# Altium schematic symbol library jlcpcb_2025_04_resistors_extended_1210.schlib: 2670 symbols (part 8 of 14) (continued)
## CR1210J30102G
designator R?  Resistance: 1kΩ  (hidden comment: *)
Resistor, 1kΩ, ±5%, 750mW, 200V, ±200ppm/℃, -55℃~+125℃, SMD 1210; Manufacturer: Uniroyal; Manufacturer Part Number: CR1210J30102G; Supplier 1: LCSC; Supplier Part Number 1: C102400; JLCPCB Part Number: C102400; Power Rating: 750mW; Category: Resistors; Package Size: 1210; JLCPCB Basic Part: Yes; Tolerance: ±5%; Voltage Rating: 200V; Temperature Coefficient: ±200ppm/℃; Temperature Rating: -55℃~+125℃; ComponentLink1Description: Datasheet; ComponentLink1URL: https://wmsc.lcsc.com/wmsc/upload/file/pdf/v2/lcsc/2304140030_LIZ-Elec-CR1210J30102G_C102400.pdf; ComponentLink2Description: JLCPCB Part URL; ComponentLink2URL: https://jlcpcb.com/partdetail/C102400
pins: 1, 2
1 alternate drawing of the same symbol

## CR1210J30103G
designator R?  Resistance: 10kΩ  (hidden comment: *)
Resistor, 10kΩ, ±5%, 750mW, 200V, ±200ppm/℃, -55℃~+125℃, SMD 1210; Manufacturer: Uniroyal; Manufacturer Part Number: CR1210J30103G; Supplier 1: LCSC; Supplier Part Number 1: C102401; JLCPCB Part Number: C102401; Power Rating: 750mW; Category: Resistors; Package Size: 1210; JLCPCB Basic Part: Yes; Tolerance: ±5%; Voltage Rating: 200V; Temperature Coefficient: ±200ppm/℃; Temperature Rating: -55℃~+125℃; ComponentLink1Description: Datasheet; ComponentLink1URL: https://wmsc.lcsc.com/wmsc/upload/file/pdf/v2/lcsc/2304140030_LIZ-Elec-CR1210J30103G_C102401.pdf; ComponentLink2Description: JLCPCB Part URL; ComponentLink2URL: https://jlcpcb.com/partdetail/C102401
pins: 1, 2
1 alternate drawing of the same symbol

## CR1210J30104G
designator R?  Resistance: 100kΩ  (hidden comment: *)
Resistor, 100kΩ, ±5%, 333.333mW, 200V, ±200ppm/℃, -55℃~+125℃, SMD 1210; Manufacturer: Uniroyal; Manufacturer Part Number: CR1210J30104G; Supplier 1: LCSC; Supplier Part Number 1: C102402; JLCPCB Part Number: C102402; Power Rating: 333.333mW; Category: Resistors; Package Size: 1210; JLCPCB Basic Part: Yes; Tolerance: ±5%; Voltage Rating: 200V; Temperature Coefficient: ±200ppm/℃; Temperature Rating: -55℃~+125℃; ComponentLink1Description: Datasheet; ComponentLink1URL: https://wmsc.lcsc.com/wmsc/upload/file/pdf/v2/lcsc/2304171100_LIZ-Elec-CR1210J30104G_C102402.pdf; ComponentLink2Description: JLCPCB Part URL; ComponentLink2URL: https://jlcpcb.com/partdetail/C102402
pins: 1, 2
1 alternate drawing of the same symbol

## CR1210J30105G
designator R?  Resistance: 1MΩ  (hidden comment: *)
Resistor, 1MΩ, ±5%, 750mW, 200V, ±200ppm/℃, -55℃~+125℃, SMD 1210; Manufacturer: Uniroyal; Manufacturer Part Number: CR1210J30105G; Supplier 1: LCSC; Supplier Part Number 1: C102403; JLCPCB Part Number: C102403; Power Rating: 750mW; Category: Resistors; Package Size: 1210; JLCPCB Basic Part: Yes; Tolerance: ±5%; Voltage Rating: 200V; Temperature Coefficient: ±200ppm/℃; Temperature Rating: -55℃~+125℃; ComponentLink1Description: Datasheet; ComponentLink1URL: https://wmsc.lcsc.com/wmsc/upload/file/pdf/v2/lcsc/2304140030_LIZ-Elec-CR1210J30105G_C102403.pdf; ComponentLink2Description: JLCPCB Part URL; ComponentLink2URL: https://jlcpcb.com/partdetail/C102403
pins: 1, 2
1 alternate drawing of the same symbol

## CR1210J30111G
designator R?  Resistance: 110Ω  (hidden comment: *)
Resistor, 110Ω, ±5%, 750mW, 200V, ±200ppm/℃, -55℃~+125℃, SMD 1210; Manufacturer: Uniroyal; Manufacturer Part Number: CR1210J30111G; Supplier 1: LCSC; Supplier Part Number 1: C102405; JLCPCB Part Number: C102405; Power Rating: 750mW; Category: Resistors; Package Size: 1210; JLCPCB Basic Part: Yes; Tolerance: ±5%; Voltage Rating: 200V; Temperature Coefficient: ±200ppm/℃; Temperature Rating: -55℃~+125℃; ComponentLink1Description: Datasheet; ComponentLink1URL: https://wmsc.lcsc.com/wmsc/upload/file/pdf/v2/lcsc/2304140030_LIZ-Elec-CR1210J30111G_C102405.pdf; ComponentLink2Description: JLCPCB Part URL; ComponentLink2URL: https://jlcpcb.com/partdetail/C102405
pins: 1, 2
1 alternate drawing of the same symbol

## CR1210J30120G
designator R?  Resistance: 12Ω  (hidden comment: *)
Resistor, 12Ω, ±5%, 750mW, 200V, ±200ppm/℃, -55℃~+125℃, SMD 1210; Manufacturer: Uniroyal; Manufacturer Part Number: CR1210J30120G; Supplier 1: LCSC; Supplier Part Number 1: C102408; JLCPCB Part Number: C102408; Power Rating: 750mW; Category: Resistors; Package Size: 1210; JLCPCB Basic Part: Yes; Tolerance: ±5%; Voltage Rating: 200V; Temperature Coefficient: ±200ppm/℃; Temperature Rating: -55℃~+125℃; ComponentLink1Description: Datasheet; ComponentLink1URL: https://wmsc.lcsc.com/wmsc/upload/file/pdf/v2/lcsc/2304140030_LIZ-Elec-CR1210J30120G_C102408.pdf; ComponentLink2Description: JLCPCB Part URL; ComponentLink2URL: https://jlcpcb.com/partdetail/C102408
pins: 1, 2
1 alternate drawing of the same symbol

## CR1210J30121G
designator R?  Resistance: 120Ω  (hidden comment: *)
Resistor, 120Ω, ±5%, 750mW, 200V, ±200ppm/℃, -55℃~+125℃, SMD 1210; Manufacturer: Uniroyal; Manufacturer Part Number: CR1210J30121G; Supplier 1: LCSC; Supplier Part Number 1: C102409; JLCPCB Part Number: C102409; Power Rating: 750mW; Category: Resistors; Package Size: 1210; JLCPCB Basic Part: Yes; Tolerance: ±5%; Voltage Rating: 200V; Temperature Coefficient: ±200ppm/℃; Temperature Rating: -55℃~+125℃; ComponentLink1Description: Datasheet; ComponentLink1URL: https://wmsc.lcsc.com/wmsc/upload/file/pdf/v2/lcsc/2304140030_LIZ-Elec-CR1210J30121G_C102409.pdf; ComponentLink2Description: JLCPCB Part URL; ComponentLink2URL: https://jlcpcb.com/partdetail/C102409
pins: 1, 2
1 alternate drawing of the same symbol

## CR1210J30122G
designator R?  Resistance: 1.2kΩ  (hidden comment: *)
Resistor, 1.2kΩ, ±5%, 750mW, 200V, ±200ppm/℃, -55℃~+125℃, SMD 1210; Manufacturer: Uniroyal; Manufacturer Part Number: CR1210J30122G; Supplier 1: LCSC; Supplier Part Number 1: C102410; JLCPCB Part Number: C102410; Power Rating: 750mW; Category: Resistors; Package Size: 1210; JLCPCB Basic Part: Yes; Tolerance: ±5%; Voltage Rating: 200V; Temperature Coefficient: ±200ppm/℃; Temperature Rating: -55℃~+125℃; ComponentLink1Description: Datasheet; ComponentLink1URL: https://wmsc.lcsc.com/wmsc/upload/file/pdf/v2/lcsc/2304140030_LIZ-Elec-CR1210J30122G_C102410.pdf; ComponentLink2Description: JLCPCB Part URL; ComponentLink2URL: https://jlcpcb.com/partdetail/C102410
pins: 1, 2
1 alternate drawing of the same symbol

## CR1210J30124G
designator R?  Resistance: 120kΩ  (hidden comment: *)
Resistor, 120kΩ, ±5%, 750mW, 200V, ±200ppm/℃, -55℃~+125℃, SMD 1210; Manufacturer: Uniroyal; Manufacturer Part Number: CR1210J30124G; Supplier 1: LCSC; Supplier Part Number 1: C102411; JLCPCB Part Number: C102411; Power Rating: 750mW; Category: Resistors; Package Size: 1210; JLCPCB Basic Part: Yes; Tolerance: ±5%; Voltage Rating: 200V; Temperature Coefficient: ±200ppm/℃; Temperature Rating: -55℃~+125℃; ComponentLink1Description: Datasheet; ComponentLink1URL: https://wmsc.lcsc.com/wmsc/upload/file/pdf/v2/lcsc/2304140030_LIZ-Elec-CR1210J30124G_C102411.pdf; ComponentLink2Description: JLCPCB Part URL; ComponentLink2URL: https://jlcpcb.com/partdetail/C102411
pins: 1, 2
1 alternate drawing of the same symbol

## CR1210J30130G
designator R?  Resistance: 13Ω  (hidden comment: *)
Resistor, 13Ω, ±5%, 750mW, 200V, ±200ppm/℃, -55℃~+125℃, SMD 1210; Manufacturer: Uniroyal; Manufacturer Part Number: CR1210J30130G; Supplier 1: LCSC; Supplier Part Number 1: C102412; JLCPCB Part Number: C102412; Power Rating: 750mW; Category: Resistors; Package Size: 1210; JLCPCB Basic Part: Yes; Tolerance: ±5%; Voltage Rating: 200V; Temperature Coefficient: ±200ppm/℃; Temperature Rating: -55℃~+125℃; ComponentLink1Description: Datasheet; ComponentLink1URL: https://wmsc.lcsc.com/wmsc/upload/file/pdf/v2/lcsc/2304140030_LIZ-Elec-CR1210J30130G_C102412.pdf; ComponentLink2Description: JLCPCB Part URL; ComponentLink2URL: https://jlcpcb.com/partdetail/C102412
pins: 1, 2
1 alternate drawing of the same symbol

## CR1210J30150G
designator R?  Resistance: 15Ω  (hidden comment: *)
Resistor, 15Ω, ±5%, 750mW, 200V, ±200ppm/℃, -55℃~+125℃, SMD 1210; Manufacturer: Uniroyal; Manufacturer Part Number: CR1210J30150G; Supplier 1: LCSC; Supplier Part Number 1: C102413; JLCPCB Part Number: C102413; Power Rating: 750mW; Category: Resistors; Package Size: 1210; JLCPCB Basic Part: Yes; Tolerance: ±5%; Voltage Rating: 200V; Temperature Coefficient: ±200ppm/℃; Temperature Rating: -55℃~+125℃; ComponentLink1Description: Datasheet; ComponentLink1URL: https://wmsc.lcsc.com/wmsc/upload/file/pdf/v2/lcsc/2304140030_LIZ-Elec-CR1210J30150G_C102413.pdf; ComponentLink2Description: JLCPCB Part URL; ComponentLink2URL: https://jlcpcb.com/partdetail/C102413
pins: 1, 2
1 alternate drawing of the same symbol

## CR1210J30152G
designator R?  Resistance: 1.5kΩ  (hidden comment: *)
Resistor, 1.5kΩ, ±5%, 750mW, 200V, ±200ppm/℃, -55℃~+125℃, SMD 1210; Manufacturer: Uniroyal; Manufacturer Part Number: CR1210J30152G; Supplier 1: LCSC; Supplier Part Number 1: C102415; JLCPCB Part Number: C102415; Power Rating: 750mW; Category: Resistors; Package Size: 1210; JLCPCB Basic Part: Yes; Tolerance: ±5%; Voltage Rating: 200V; Temperature Coefficient: ±200ppm/℃; Temperature Rating: -55℃~+125℃; ComponentLink1Description: Datasheet; ComponentLink1URL: https://wmsc.lcsc.com/wmsc/upload/file/pdf/v2/lcsc/2304140030_LIZ-Elec-CR1210J30152G_C102415.pdf; ComponentLink2Description: JLCPCB Part URL; ComponentLink2URL: https://jlcpcb.com/partdetail/C102415
pins: 1, 2
1 alternate drawing of the same symbol

## CR1210J30154G
designator R?  Resistance: 150kΩ  (hidden comment: *)
Resistor, 150kΩ, ±5%, 750mW, 200V, ±200ppm/℃, -55℃~+125℃, SMD 1210; Manufacturer: Uniroyal; Manufacturer Part Number: CR1210J30154G; Supplier 1: LCSC; Supplier Part Number 1: C102416; JLCPCB Part Number: C102416; Power Rating: 750mW; Category: Resistors; Package Size: 1210; JLCPCB Basic Part: Yes; Tolerance: ±5%; Voltage Rating: 200V; Temperature Coefficient: ±200ppm/℃; Temperature Rating: -55℃~+125℃; ComponentLink1Description: Datasheet; ComponentLink1URL: https://wmsc.lcsc.com/wmsc/upload/file/pdf/v2/lcsc/2304140030_LIZ-Elec-CR1210J30154G_C102416.pdf; ComponentLink2Description: JLCPCB Part URL; ComponentLink2URL: https://jlcpcb.com/partdetail/C102416
pins: 1, 2
1 alternate drawing of the same symbol

## CR1210J30161G
designator R?  Resistance: 160Ω  (hidden comment: *)
Resistor, 160Ω, ±5%, 750mW, 200V, ±200ppm/℃, -55℃~+125℃, SMD 1210; Manufacturer: Uniroyal; Manufacturer Part Number: CR1210J30161G; Supplier 1: LCSC; Supplier Part Number 1: C102418; JLCPCB Part Number: C102418; Power Rating: 750mW; Category: Resistors; Package Size: 1210; JLCPCB Basic Part: Yes; Tolerance: ±5%; Voltage Rating: 200V; Temperature Coefficient: ±200ppm/℃; Temperature Rating: -55℃~+125℃; ComponentLink1Description: Datasheet; ComponentLink1URL: https://wmsc.lcsc.com/wmsc/upload/file/pdf/v2/lcsc/2304140030_LIZ-Elec-CR1210J30161G_C102418.pdf; ComponentLink2Description: JLCPCB Part URL; ComponentLink2URL: https://jlcpcb.com/partdetail/C102418
pins: 1, 2
1 alternate drawing of the same symbol

## CR1210J30180G
designator R?  Resistance: 18Ω  (hidden comment: *)
Resistor, 18Ω, ±5%, 750mW, 200V, ±200ppm/℃, -55℃~+125℃, SMD 1210; Manufacturer: Uniroyal; Manufacturer Part Number: CR1210J30180G; Supplier 1: LCSC; Supplier Part Number 1: C102419; JLCPCB Part Number: C102419; Power Rating: 750mW; Category: Resistors; Package Size: 1210; JLCPCB Basic Part: Yes; Tolerance: ±5%; Voltage Rating: 200V; Temperature Coefficient: ±200ppm/℃; Temperature Rating: -55℃~+125℃; ComponentLink1Description: Datasheet; ComponentLink1URL: https://wmsc.lcsc.com/wmsc/upload/file/pdf/v2/lcsc/2304140030_LIZ-Elec-CR1210J30180G_C102419.pdf; ComponentLink2Description: JLCPCB Part URL; ComponentLink2URL: https://jlcpcb.com/partdetail/C102419
pins: 1, 2
1 alternate drawing of the same symbol

## CR1210J30201G
designator R?  Resistance: 200Ω  (hidden comment: *)
Resistor, 200Ω, ±5%, 750mW, 200V, ±200ppm/℃, -55℃~+125℃, SMD 1210; Manufacturer: Uniroyal; Manufacturer Part Number: CR1210J30201G; Supplier 1: LCSC; Supplier Part Number 1: C102427; JLCPCB Part Number: C102427; Power Rating: 750mW; Category: Resistors; Package Size: 1210; JLCPCB Basic Part: Yes; Tolerance: ±5%; Voltage Rating: 200V; Temperature Coefficient: ±200ppm/℃; Temperature Rating: -55℃~+125℃; ComponentLink1Description: Datasheet; ComponentLink1URL: https://wmsc.lcsc.com/wmsc/upload/file/pdf/v2/lcsc/2304140030_LIZ-Elec-CR1210J30201G_C102427.pdf; ComponentLink2Description: JLCPCB Part URL; ComponentLink2URL: https://jlcpcb.com/partdetail/C102427
pins: 1, 2
1 alternate drawing of the same symbol

## CR1210J30202G
designator R?  Resistance: 2kΩ  (hidden comment: *)
Resistor, 2kΩ, ±5%, 750mW, 200V, ±200ppm/℃, -55℃~+125℃, SMD 1210; Manufacturer: Uniroyal; Manufacturer Part Number: CR1210J30202G; Supplier 1: LCSC; Supplier Part Number 1: C102428; JLCPCB Part Number: C102428; Power Rating: 750mW; Category: Resistors; Package Size: 1210; JLCPCB Basic Part: Yes; Tolerance: ±5%; Voltage Rating: 200V; Temperature Coefficient: ±200ppm/℃; Temperature Rating: -55℃~+125℃; ComponentLink1Description: Datasheet; ComponentLink1URL: https://wmsc.lcsc.com/wmsc/upload/file/pdf/v2/lcsc/2304140030_LIZ-Elec-CR1210J30202G_C102428.pdf; ComponentLink2Description: JLCPCB Part URL; ComponentLink2URL: https://jlcpcb.com/partdetail/C102428
pins: 1, 2
1 alternate drawing of the same symbol

## CR1210J30203G
designator R?  Resistance: 20kΩ  (hidden comment: *)
Resistor, 20kΩ, ±5%, 750mW, 200V, ±200ppm/℃, -55℃~+125℃, SMD 1210; Manufacturer: Uniroyal; Manufacturer Part Number: CR1210J30203G; Supplier 1: LCSC; Supplier Part Number 1: C102429; JLCPCB Part Number: C102429; Power Rating: 750mW; Category: Resistors; Package Size: 1210; JLCPCB Basic Part: Yes; Tolerance: ±5%; Voltage Rating: 200V; Temperature Coefficient: ±200ppm/℃; Temperature Rating: -55℃~+125℃; ComponentLink1Description: Datasheet; ComponentLink1URL: https://wmsc.lcsc.com/wmsc/upload/file/pdf/v2/lcsc/2304140030_LIZ-Elec-CR1210J30203G_C102429.pdf; ComponentLink2Description: JLCPCB Part URL; ComponentLink2URL: https://jlcpcb.com/partdetail/C102429
pins: 1, 2
1 alternate drawing of the same symbol

## CR1210J30204G
designator R?  Resistance: 200kΩ  (hidden comment: *)
Resistor, 200kΩ, ±5%, 750mW, 200V, ±200ppm/℃, -55℃~+125℃, SMD 1210; Manufacturer: Uniroyal; Manufacturer Part Number: CR1210J30204G; Supplier 1: LCSC; Supplier Part Number 1: C102430; JLCPCB Part Number: C102430; Power Rating: 750mW; Category: Resistors; Package Size: 1210; JLCPCB Basic Part: Yes; Tolerance: ±5%; Voltage Rating: 200V; Temperature Coefficient: ±200ppm/℃; Temperature Rating: -55℃~+125℃; ComponentLink1Description: Datasheet; ComponentLink1URL: https://wmsc.lcsc.com/wmsc/upload/file/pdf/v2/lcsc/2304140030_LIZ-Elec-CR1210J30204G_C102430.pdf; ComponentLink2Description: JLCPCB Part URL; ComponentLink2URL: https://jlcpcb.com/partdetail/C102430
pins: 1, 2
1 alternate drawing of the same symbol

## CR1210J30221G
designator R?  Resistance: 220Ω  (hidden comment: *)
Resistor, 220Ω, ±5%, SMD 1210; Manufacturer: Uniroyal; Manufacturer Part Number: CR1210J30221G; Supplier 1: LCSC; Supplier Part Number 1: C102433; JLCPCB Part Number: C102433; Category: Resistors; Package Size: 1210; JLCPCB Basic Part: Yes; Tolerance: ±5%; ComponentLink1Description: Datasheet; ComponentLink1URL: https://wmsc.lcsc.com/wmsc/upload/file/pdf/v2/lcsc/2304140030_LIZ-Elec-CR1210J30221G_C102433.pdf; ComponentLink2Description: JLCPCB Part URL; ComponentLink2URL: https://jlcpcb.com/partdetail/C102433
pins: 1, 2
1 alternate drawing of the same symbol

## CR1210J30222G
designator R?  Resistance: 2.2kΩ  (hidden comment: *)
Resistor, 2.2kΩ, ±5%, SMD 1210; Manufacturer: Uniroyal; Manufacturer Part Number: CR1210J30222G; Supplier 1: LCSC; Supplier Part Number 1: C102434; JLCPCB Part Number: C102434; Category: Resistors; Package Size: 1210; JLCPCB Basic Part: Yes; Tolerance: ±5%; ComponentLink1Description: Datasheet; ComponentLink1URL: https://wmsc.lcsc.com/wmsc/upload/file/pdf/v2/lcsc/2304140030_LIZ-Elec-CR1210J30222G_C102434.pdf; ComponentLink2Description: JLCPCB Part URL; ComponentLink2URL: https://jlcpcb.com/partdetail/C102434
pins: 1, 2
1 alternate drawing of the same symbol

## CR1210J30223G
designator R?  Resistance: 22kΩ  (hidden comment: *)
Resistor, 22kΩ, ±5%, 333.333mW, SMD 1210; Manufacturer: Uniroyal; Manufacturer Part Number: CR1210J30223G; Supplier 1: LCSC; Supplier Part Number 1: C102435; JLCPCB Part Number: C102435; Power Rating: 333.333mW; Category: Resistors; Package Size: 1210; JLCPCB Basic Part: Yes; Tolerance: ±5%; ComponentLink1Description: Datasheet; ComponentLink1URL: https://wmsc.lcsc.com/wmsc/upload/file/pdf/v2/lcsc/2304140030_LIZ-Elec-CR1210J30223G_C102435.pdf; ComponentLink2Description: JLCPCB Part URL; ComponentLink2URL: https://jlcpcb.com/partdetail/C102435
pins: 1, 2
1 alternate drawing of the same symbol

## CR1210J30224G
designator R?  Resistance: 220kΩ  (hidden comment: *)
Resistor, 220kΩ, ±5%, 750mW, 200V, ±200ppm/℃, -55℃~+125℃, SMD 1210; Manufacturer: Uniroyal; Manufacturer Part Number: CR1210J30224G; Supplier 1: LCSC; Supplier Part Number 1: C102436; JLCPCB Part Number: C102436; Power Rating: 750mW; Category: Resistors; Package Size: 1210; JLCPCB Basic Part: Yes; Tolerance: ±5%; Voltage Rating: 200V; Temperature Coefficient: ±200ppm/℃; Temperature Rating: -55℃~+125℃; ComponentLink1Description: Datasheet; ComponentLink1URL: https://wmsc.lcsc.com/wmsc/upload/file/pdf/v2/lcsc/2304140030_LIZ-Elec-CR1210J30224G_C102436.pdf; ComponentLink2Description: JLCPCB Part URL; ComponentLink2URL: https://jlcpcb.com/partdetail/C102436
pins: 1, 2
1 alternate drawing of the same symbol

## CR1210J30240G
designator R?  Resistance: 24Ω  (hidden comment: *)
Resistor, 24Ω, ±5%, 750mW, 200V, ±200ppm/℃, -55℃~+125℃, SMD 1210; Manufacturer: Uniroyal; Manufacturer Part Number: CR1210J30240G; Supplier 1: LCSC; Supplier Part Number 1: C102437; JLCPCB Part Number: C102437; Power Rating: 750mW; Category: Resistors; Package Size: 1210; JLCPCB Basic Part: Yes; Tolerance: ±5%; Voltage Rating: 200V; Temperature Coefficient: ±200ppm/℃; Temperature Rating: -55℃~+125℃; ComponentLink1Description: Datasheet; ComponentLink1URL: https://wmsc.lcsc.com/wmsc/upload/file/pdf/v2/lcsc/2304140030_LIZ-Elec-CR1210J30240G_C102437.pdf; ComponentLink2Description: JLCPCB Part URL; ComponentLink2URL: https://jlcpcb.com/partdetail/C102437
pins: 1, 2
1 alternate drawing of the same symbol

## CR1210J30241G
designator R?  Resistance: 240Ω  (hidden comment: *)
Resistor, 240Ω, ±5%, 750mW, 200V, ±200ppm/℃, -55℃~+125℃, SMD 1210; Manufacturer: Uniroyal; Manufacturer Part Number: CR1210J30241G; Supplier 1: LCSC; Supplier Part Number 1: C102438; JLCPCB Part Number: C102438; Power Rating: 750mW; Category: Resistors; Package Size: 1210; JLCPCB Basic Part: Yes; Tolerance: ±5%; Voltage Rating: 200V; Temperature Coefficient: ±200ppm/℃; Temperature Rating: -55℃~+125℃; ComponentLink1Description: Datasheet; ComponentLink1URL: https://wmsc.lcsc.com/wmsc/upload/file/pdf/v2/lcsc/2304140030_LIZ-Elec-CR1210J30241G_C102438.pdf; ComponentLink2Description: JLCPCB Part URL; ComponentLink2URL: https://jlcpcb.com/partdetail/C102438
pins: 1, 2
1 alternate drawing of the same symbol

## CR1210J30244G
designator R?  Resistance: 240kΩ  (hidden comment: *)
Resistor, 240kΩ, ±5%, 750mW, 200V, ±200ppm/℃, -55℃~+125℃, SMD 1210; Manufacturer: Uniroyal; Manufacturer Part Number: CR1210J30244G; Supplier 1: LCSC; Supplier Part Number 1: C102441; JLCPCB Part Number: C102441; Power Rating: 750mW; Category: Resistors; Package Size: 1210; JLCPCB Basic Part: Yes; Tolerance: ±5%; Voltage Rating: 200V; Temperature Coefficient: ±200ppm/℃; Temperature Rating: -55℃~+125℃; ComponentLink1Description: Datasheet; ComponentLink1URL: https://wmsc.lcsc.com/wmsc/upload/file/pdf/v2/lcsc/2304140030_LIZ-Elec-CR1210J30244G_C102441.pdf; ComponentLink2Description: JLCPCB Part URL; ComponentLink2URL: https://jlcpcb.com/partdetail/C102441
pins: 1, 2
1 alternate drawing of the same symbol

## CR1210J30270G
designator R?  Resistance: 27Ω  (hidden comment: *)
Resistor, 27Ω, ±5%, 750mW, 200V, ±200ppm/℃, -55℃~+125℃, SMD 1210; Manufacturer: Uniroyal; Manufacturer Part Number: CR1210J30270G; Supplier 1: LCSC; Supplier Part Number 1: C102442; JLCPCB Part Number: C102442; Power Rating: 750mW; Category: Resistors; Package Size: 1210; JLCPCB Basic Part: Yes; Tolerance: ±5%; Voltage Rating: 200V; Temperature Coefficient: ±200ppm/℃; Temperature Rating: -55℃~+125℃; ComponentLink1Description: Datasheet; ComponentLink1URL: https://wmsc.lcsc.com/wmsc/upload/file/pdf/v2/lcsc/2304140030_LIZ-Elec-CR1210J30270G_C102442.pdf; ComponentLink2Description: JLCPCB Part URL; ComponentLink2URL: https://jlcpcb.com/partdetail/C102442
pins: 1, 2
1 alternate drawing of the same symbol

## CR1210J30273G
designator R?  Resistance: 27kΩ  (hidden comment: *)
Resistor, 27kΩ, ±5%, 750mW, 200V, ±200ppm/℃, -55℃~+125℃, SMD 1210; Manufacturer: Uniroyal; Manufacturer Part Number: CR1210J30273G; Supplier 1: LCSC; Supplier Part Number 1: C102445; JLCPCB Part Number: C102445; Power Rating: 750mW; Category: Resistors; Package Size: 1210; JLCPCB Basic Part: Yes; Tolerance: ±5%; Voltage Rating: 200V; Temperature Coefficient: ±200ppm/℃; Temperature Rating: -55℃~+125℃; ComponentLink1Description: Datasheet; ComponentLink1URL: https://wmsc.lcsc.com/wmsc/upload/file/pdf/v2/lcsc/2304140030_LIZ-Elec-CR1210J30273G_C102445.pdf; ComponentLink2Description: JLCPCB Part URL; ComponentLink2URL: https://jlcpcb.com/partdetail/C102445
pins: 1, 2
1 alternate drawing of the same symbol

## CR1210J30300G
designator R?  Resistance: 30Ω  (hidden comment: *)
Resistor, 30Ω, ±5%, 750mW, 200V, ±200ppm/℃, -55℃~+125℃, SMD 1210; Manufacturer: Uniroyal; Manufacturer Part Number: CR1210J30300G; Supplier 1: LCSC; Supplier Part Number 1: C102450; JLCPCB Part Number: C102450; Power Rating: 750mW; Category: Resistors; Package Size: 1210; JLCPCB Basic Part: Yes; Tolerance: ±5%; Voltage Rating: 200V; Temperature Coefficient: ±200ppm/℃; Temperature Rating: -55℃~+125℃; ComponentLink1Description: Datasheet; ComponentLink1URL: https://wmsc.lcsc.com/wmsc/upload/file/pdf/v2/lcsc/2304140030_LIZ-Elec-CR1210J30300G_C102450.pdf; ComponentLink2Description: JLCPCB Part URL; ComponentLink2URL: https://jlcpcb.com/partdetail/C102450
pins: 1, 2
1 alternate drawing of the same symbol

## CR1210J30301G
designator R?  Resistance: 300Ω  (hidden comment: *)
Resistor, 300Ω, ±5%, 750mW, 200V, ±200ppm/℃, -55℃~+125℃, SMD 1210; Manufacturer: Uniroyal; Manufacturer Part Number: CR1210J30301G; Supplier 1: LCSC; Supplier Part Number 1: C102451; JLCPCB Part Number: C102451; Power Rating: 750mW; Category: Resistors; Package Size: 1210; JLCPCB Basic Part: Yes; Tolerance: ±5%; Voltage Rating: 200V; Temperature Coefficient: ±200ppm/℃; Temperature Rating: -55℃~+125℃; ComponentLink1Description: Datasheet; ComponentLink1URL: https://wmsc.lcsc.com/wmsc/upload/file/pdf/v2/lcsc/2304140030_LIZ-Elec-CR1210J30301G_C102451.pdf; ComponentLink2Description: JLCPCB Part URL; ComponentLink2URL: https://jlcpcb.com/partdetail/C102451
pins: 1, 2
1 alternate drawing of the same symbol

## CR1210J30302G
designator R?  Resistance: 3kΩ  (hidden comment: *)
Resistor, 3kΩ, ±5%, 750mW, 200V, ±200ppm/℃, -55℃~+125℃, SMD 1210; Manufacturer: Uniroyal; Manufacturer Part Number: CR1210J30302G; Supplier 1: LCSC; Supplier Part Number 1: C102452; JLCPCB Part Number: C102452; Power Rating: 750mW; Category: Resistors; Package Size: 1210; JLCPCB Basic Part: Yes; Tolerance: ±5%; Voltage Rating: 200V; Temperature Coefficient: ±200ppm/℃; Temperature Rating: -55℃~+125℃; ComponentLink1Description: Datasheet; ComponentLink1URL: https://wmsc.lcsc.com/wmsc/upload/file/pdf/v2/lcsc/2304140030_LIZ-Elec-CR1210J30302G_C102452.pdf; ComponentLink2Description: JLCPCB Part URL; ComponentLink2URL: https://jlcpcb.com/partdetail/C102452
pins: 1, 2
1 alternate drawing of the same symbol

## CR1210J30303G
designator R?  Resistance: 30kΩ  (hidden comment: *)
Resistor, 30kΩ, ±5%, 750mW, 200V, ±200ppm/℃, -55℃~+125℃, SMD 1210; Manufacturer: Uniroyal; Manufacturer Part Number: CR1210J30303G; Supplier 1: LCSC; Supplier Part Number 1: C102453; JLCPCB Part Number: C102453; Power Rating: 750mW; Category: Resistors; Package Size: 1210; JLCPCB Basic Part: Yes; Tolerance: ±5%; Voltage Rating: 200V; Temperature Coefficient: ±200ppm/℃; Temperature Rating: -55℃~+125℃; ComponentLink1Description: Datasheet; ComponentLink1URL: https://wmsc.lcsc.com/wmsc/upload/file/pdf/v2/lcsc/2304140030_LIZ-Elec-CR1210J30303G_C102453.pdf; ComponentLink2Description: JLCPCB Part URL; ComponentLink2URL: https://jlcpcb.com/partdetail/C102453
pins: 1, 2
1 alternate drawing of the same symbol

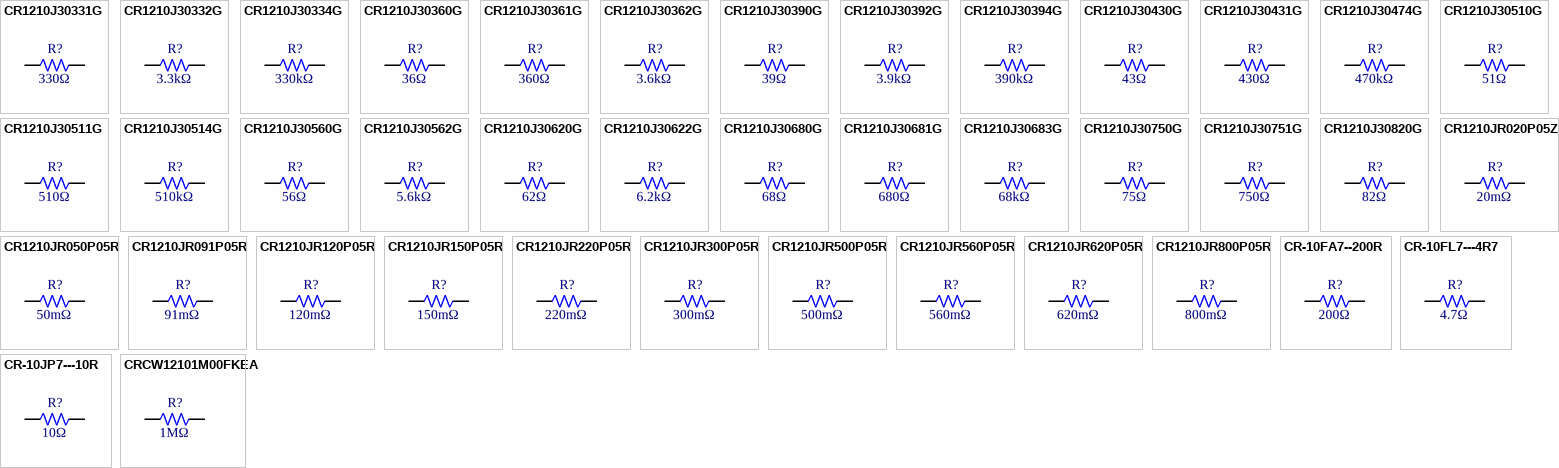
[diagram p37: symbols CR1210J30331G to CRCW12101M00FKEA]

## CR1210J30331G
designator R?  Resistance: 330Ω  (hidden comment: *)
Resistor, 330Ω, ±5%, 750mW, 200V, ±200ppm/℃, -55℃~+125℃, SMD 1210; Manufacturer: Uniroyal; Manufacturer Part Number: CR1210J30331G; Supplier 1: LCSC; Supplier Part Number 1: C102455; JLCPCB Part Number: C102455; Power Rating: 750mW; Category: Resistors; Package Size: 1210; JLCPCB Basic Part: Yes; Tolerance: ±5%; Voltage Rating: 200V; Temperature Coefficient: ±200ppm/℃; Temperature Rating: -55℃~+125℃; ComponentLink1Description: Datasheet; ComponentLink1URL: https://wmsc.lcsc.com/wmsc/upload/file/pdf/v2/lcsc/2304140030_LIZ-Elec-CR1210J30331G_C102455.pdf; ComponentLink2Description: JLCPCB Part URL; ComponentLink2URL: https://jlcpcb.com/partdetail/C102455
pins: 1, 2
1 alternate drawing of the same symbol

## CR1210J30332G
designator R?  Resistance: 3.3kΩ  (hidden comment: *)
Resistor, 3.3kΩ, ±5%, 750mW, 200V, ±200ppm/℃, -55℃~+125℃, SMD 1210; Manufacturer: Uniroyal; Manufacturer Part Number: CR1210J30332G; Supplier 1: LCSC; Supplier Part Number 1: C102456; JLCPCB Part Number: C102456; Power Rating: 750mW; Category: Resistors; Package Size: 1210; JLCPCB Basic Part: Yes; Tolerance: ±5%; Voltage Rating: 200V; Temperature Coefficient: ±200ppm/℃; Temperature Rating: -55℃~+125℃; ComponentLink1Description: Datasheet; ComponentLink1URL: https://wmsc.lcsc.com/wmsc/upload/file/pdf/v2/lcsc/2304140030_LIZ-Elec-CR1210J30332G_C102456.pdf; ComponentLink2Description: JLCPCB Part URL; ComponentLink2URL: https://jlcpcb.com/partdetail/C102456
pins: 1, 2
1 alternate drawing of the same symbol

## CR1210J30334G
designator R?  Resistance: 330kΩ  (hidden comment: *)
Resistor, 330kΩ, ±5%, 750mW, 200V, ±200ppm/℃, -55℃~+125℃, SMD 1210; Manufacturer: Uniroyal; Manufacturer Part Number: CR1210J30334G; Supplier 1: LCSC; Supplier Part Number 1: C102458; JLCPCB Part Number: C102458; Power Rating: 750mW; Category: Resistors; Package Size: 1210; JLCPCB Basic Part: Yes; Tolerance: ±5%; Voltage Rating: 200V; Temperature Coefficient: ±200ppm/℃; Temperature Rating: -55℃~+125℃; ComponentLink1Description: Datasheet; ComponentLink1URL: https://wmsc.lcsc.com/wmsc/upload/file/pdf/v2/lcsc/2304140030_LIZ-Elec-CR1210J30334G_C102458.pdf; ComponentLink2Description: JLCPCB Part URL; ComponentLink2URL: https://jlcpcb.com/partdetail/C102458
pins: 1, 2
1 alternate drawing of the same symbol

## CR1210J30360G
designator R?  Resistance: 36Ω  (hidden comment: *)
Resistor, 36Ω, ±5%, 750mW, 200V, ±200ppm/℃, -55℃~+125℃, SMD 1210; Manufacturer: Uniroyal; Manufacturer Part Number: CR1210J30360G; Supplier 1: LCSC; Supplier Part Number 1: C102459; JLCPCB Part Number: C102459; Power Rating: 750mW; Category: Resistors; Package Size: 1210; JLCPCB Basic Part: Yes; Tolerance: ±5%; Voltage Rating: 200V; Temperature Coefficient: ±200ppm/℃; Temperature Rating: -55℃~+125℃; ComponentLink1Description: Datasheet; ComponentLink1URL: https://wmsc.lcsc.com/wmsc/upload/file/pdf/v2/lcsc/2304140030_LIZ-Elec-CR1210J30360G_C102459.pdf; ComponentLink2Description: JLCPCB Part URL; ComponentLink2URL: https://jlcpcb.com/partdetail/C102459
pins: 1, 2
1 alternate drawing of the same symbol

## CR1210J30361G
designator R?  Resistance: 360Ω  (hidden comment: *)
Resistor, 360Ω, ±5%, 750mW, 200V, ±200ppm/℃, -55℃~+125℃, SMD 1210; Manufacturer: Uniroyal; Manufacturer Part Number: CR1210J30361G; Supplier 1: LCSC; Supplier Part Number 1: C102460; JLCPCB Part Number: C102460; Power Rating: 750mW; Category: Resistors; Package Size: 1210; JLCPCB Basic Part: Yes; Tolerance: ±5%; Voltage Rating: 200V; Temperature Coefficient: ±200ppm/℃; Temperature Rating: -55℃~+125℃; ComponentLink1Description: Datasheet; ComponentLink1URL: https://wmsc.lcsc.com/wmsc/upload/file/pdf/v2/lcsc/2304140030_LIZ-Elec-CR1210J30361G_C102460.pdf; ComponentLink2Description: JLCPCB Part URL; ComponentLink2URL: https://jlcpcb.com/partdetail/C102460
pins: 1, 2
1 alternate drawing of the same symbol

## CR1210J30362G
designator R?  Resistance: 3.6kΩ  (hidden comment: *)
Resistor, 3.6kΩ, ±5%, 750mW, 200V, ±200ppm/℃, -55℃~+125℃, SMD 1210; Manufacturer: Uniroyal; Manufacturer Part Number: CR1210J30362G; Supplier 1: LCSC; Supplier Part Number 1: C102461; JLCPCB Part Number: C102461; Power Rating: 750mW; Category: Resistors; Package Size: 1210; JLCPCB Basic Part: Yes; Tolerance: ±5%; Voltage Rating: 200V; Temperature Coefficient: ±200ppm/℃; Temperature Rating: -55℃~+125℃; ComponentLink1Description: Datasheet; ComponentLink1URL: https://wmsc.lcsc.com/wmsc/upload/file/pdf/v2/lcsc/2304140030_LIZ-Elec-CR1210J30362G_C102461.pdf; ComponentLink2Description: JLCPCB Part URL; ComponentLink2URL: https://jlcpcb.com/partdetail/C102461
pins: 1, 2
1 alternate drawing of the same symbol

## CR1210J30390G
designator R?  Resistance: 39Ω  (hidden comment: *)
Resistor, 39Ω, ±5%, 750mW, 200V, ±200ppm/℃, -55℃~+125℃, SMD 1210; Manufacturer: Uniroyal; Manufacturer Part Number: CR1210J30390G; Supplier 1: LCSC; Supplier Part Number 1: C102462; JLCPCB Part Number: C102462; Power Rating: 750mW; Category: Resistors; Package Size: 1210; JLCPCB Basic Part: Yes; Tolerance: ±5%; Voltage Rating: 200V; Temperature Coefficient: ±200ppm/℃; Temperature Rating: -55℃~+125℃; ComponentLink1Description: Datasheet; ComponentLink1URL: https://wmsc.lcsc.com/wmsc/upload/file/pdf/v2/lcsc/2304140030_LIZ-Elec-CR1210J30390G_C102462.pdf; ComponentLink2Description: JLCPCB Part URL; ComponentLink2URL: https://jlcpcb.com/partdetail/C102462
pins: 1, 2
1 alternate drawing of the same symbol

## CR1210J30392G
designator R?  Resistance: 3.9kΩ  (hidden comment: *)
Resistor, 3.9kΩ, ±5%, 750mW, 200V, ±200ppm/℃, -55℃~+125℃, SMD 1210; Manufacturer: Uniroyal; Manufacturer Part Number: CR1210J30392G; Supplier 1: LCSC; Supplier Part Number 1: C102464; JLCPCB Part Number: C102464; Power Rating: 750mW; Category: Resistors; Package Size: 1210; JLCPCB Basic Part: Yes; Tolerance: ±5%; Voltage Rating: 200V; Temperature Coefficient: ±200ppm/℃; Temperature Rating: -55℃~+125℃; ComponentLink1Description: Datasheet; ComponentLink1URL: https://wmsc.lcsc.com/wmsc/upload/file/pdf/v2/lcsc/2304140030_LIZ-Elec-CR1210J30392G_C102464.pdf; ComponentLink2Description: JLCPCB Part URL; ComponentLink2URL: https://jlcpcb.com/partdetail/C102464
pins: 1, 2
1 alternate drawing of the same symbol

## CR1210J30394G
designator R?  Resistance: 390kΩ  (hidden comment: *)
Resistor, 390kΩ, ±5%, 750mW, 200V, ±200ppm/℃, -55℃~+125℃, SMD 1210; Manufacturer: Uniroyal; Manufacturer Part Number: CR1210J30394G; Supplier 1: LCSC; Supplier Part Number 1: C102465; JLCPCB Part Number: C102465; Power Rating: 750mW; Category: Resistors; Package Size: 1210; JLCPCB Basic Part: Yes; Tolerance: ±5%; Voltage Rating: 200V; Temperature Coefficient: ±200ppm/℃; Temperature Rating: -55℃~+125℃; ComponentLink1Description: Datasheet; ComponentLink1URL: https://wmsc.lcsc.com/wmsc/upload/file/pdf/v2/lcsc/2304140030_LIZ-Elec-CR1210J30394G_C102465.pdf; ComponentLink2Description: JLCPCB Part URL; ComponentLink2URL: https://jlcpcb.com/partdetail/C102465
pins: 1, 2
1 alternate drawing of the same symbol

## CR1210J30430G
designator R?  Resistance: 43Ω  (hidden comment: *)
Resistor, 43Ω, ±5%, 750mW, 200V, ±200ppm/℃, -55℃~+125℃, SMD 1210; Manufacturer: Uniroyal; Manufacturer Part Number: CR1210J30430G; Supplier 1: LCSC; Supplier Part Number 1: C102468; JLCPCB Part Number: C102468; Power Rating: 750mW; Category: Resistors; Package Size: 1210; JLCPCB Basic Part: Yes; Tolerance: ±5%; Voltage Rating: 200V; Temperature Coefficient: ±200ppm/℃; Temperature Rating: -55℃~+125℃; ComponentLink1Description: Datasheet; ComponentLink1URL: https://wmsc.lcsc.com/wmsc/upload/file/pdf/v2/lcsc/2304140030_LIZ-Elec-CR1210J30430G_C102468.pdf; ComponentLink2Description: JLCPCB Part URL; ComponentLink2URL: https://jlcpcb.com/partdetail/C102468
pins: 1, 2
1 alternate drawing of the same symbol

## CR1210J30431G
designator R?  Resistance: 430Ω  (hidden comment: *)
Resistor, 430Ω, ±5%, 750mW, 200V, ±200ppm/℃, -55℃~+125℃, SMD 1210; Manufacturer: Uniroyal; Manufacturer Part Number: CR1210J30431G; Supplier 1: LCSC; Supplier Part Number 1: C102469; JLCPCB Part Number: C102469; Power Rating: 750mW; Category: Resistors; Package Size: 1210; JLCPCB Basic Part: Yes; Tolerance: ±5%; Voltage Rating: 200V; Temperature Coefficient: ±200ppm/℃; Temperature Rating: -55℃~+125℃; ComponentLink1Description: Datasheet; ComponentLink1URL: https://wmsc.lcsc.com/wmsc/upload/file/pdf/v2/lcsc/2304140030_LIZ-Elec-CR1210J30431G_C102469.pdf; ComponentLink2Description: JLCPCB Part URL; ComponentLink2URL: https://jlcpcb.com/partdetail/C102469
pins: 1, 2
1 alternate drawing of the same symbol

## CR1210J30474G
designator R?  Resistance: 470kΩ  (hidden comment: *)
Resistor, 470kΩ, ±5%, 750mW, 200V, ±200ppm/℃, -55℃~+125℃, SMD 1210; Manufacturer: Uniroyal; Manufacturer Part Number: CR1210J30474G; Supplier 1: LCSC; Supplier Part Number 1: C102476; JLCPCB Part Number: C102476; Power Rating: 750mW; Category: Resistors; Package Size: 1210; JLCPCB Basic Part: Yes; Tolerance: ±5%; Voltage Rating: 200V; Temperature Coefficient: ±200ppm/℃; Temperature Rating: -55℃~+125℃; ComponentLink1Description: Datasheet; ComponentLink1URL: https://wmsc.lcsc.com/wmsc/upload/file/pdf/v2/lcsc/2304140030_LIZ-Elec-CR1210J30474G_C102476.pdf; ComponentLink2Description: JLCPCB Part URL; ComponentLink2URL: https://jlcpcb.com/partdetail/C102476
pins: 1, 2
1 alternate drawing of the same symbol

## CR1210J30510G
designator R?  Resistance: 51Ω  (hidden comment: *)
Resistor, 51Ω, ±5%, 750mW, 200V, ±200ppm/℃, -55℃~+125℃, SMD 1210; Manufacturer: Uniroyal; Manufacturer Part Number: CR1210J30510G; Supplier 1: LCSC; Supplier Part Number 1: C102479; JLCPCB Part Number: C102479; Power Rating: 750mW; Category: Resistors; Package Size: 1210; JLCPCB Basic Part: Yes; Tolerance: ±5%; Voltage Rating: 200V; Temperature Coefficient: ±200ppm/℃; Temperature Rating: -55℃~+125℃; ComponentLink1Description: Datasheet; ComponentLink1URL: https://wmsc.lcsc.com/wmsc/upload/file/pdf/v2/lcsc/2304140030_LIZ-Elec-CR1210J30510G_C102479.pdf; ComponentLink2Description: JLCPCB Part URL; ComponentLink2URL: https://jlcpcb.com/partdetail/C102479
pins: 1, 2
1 alternate drawing of the same symbol

## CR1210J30511G
designator R?  Resistance: 510Ω  (hidden comment: *)
Resistor, 510Ω, ±5%, 200V, SMD 1210; Manufacturer: Uniroyal; Manufacturer Part Number: CR1210J30511G; Supplier 1: LCSC; Supplier Part Number 1: C102480; JLCPCB Part Number: C102480; Category: Resistors; Package Size: 1210; JLCPCB Basic Part: Yes; Tolerance: ±5%; Voltage Rating: 200V; ComponentLink1Description: Datasheet; ComponentLink1URL: https://wmsc.lcsc.com/wmsc/upload/file/pdf/v2/lcsc/2304140030_LIZ-Elec-CR1210J30511G_C102480.pdf; ComponentLink2Description: JLCPCB Part URL; ComponentLink2URL: https://jlcpcb.com/partdetail/C102480
pins: 1, 2
1 alternate drawing of the same symbol

## CR1210J30514G
designator R?  Resistance: 510kΩ  (hidden comment: *)
Resistor, 510kΩ, ±5%, 750mW, 200V, ±200ppm/℃, -55℃~+125℃, SMD 1210; Manufacturer: Uniroyal; Manufacturer Part Number: CR1210J30514G; Supplier 1: LCSC; Supplier Part Number 1: C102483; JLCPCB Part Number: C102483; Power Rating: 750mW; Category: Resistors; Package Size: 1210; JLCPCB Basic Part: Yes; Tolerance: ±5%; Voltage Rating: 200V; Temperature Coefficient: ±200ppm/℃; Temperature Rating: -55℃~+125℃; ComponentLink1Description: Datasheet; ComponentLink1URL: https://wmsc.lcsc.com/wmsc/upload/file/pdf/v2/lcsc/2304140030_LIZ-Elec-CR1210J30514G_C102483.pdf; ComponentLink2Description: JLCPCB Part URL; ComponentLink2URL: https://jlcpcb.com/partdetail/C102483
pins: 1, 2
1 alternate drawing of the same symbol

## CR1210J30560G
designator R?  Resistance: 56Ω  (hidden comment: *)
Resistor, 56Ω, ±5%, 750mW, 200V, ±200ppm/℃, -55℃~+125℃, SMD 1210; Manufacturer: Uniroyal; Manufacturer Part Number: CR1210J30560G; Supplier 1: LCSC; Supplier Part Number 1: C102484; JLCPCB Part Number: C102484; Power Rating: 750mW; Category: Resistors; Package Size: 1210; JLCPCB Basic Part: Yes; Tolerance: ±5%; Voltage Rating: 200V; Temperature Coefficient: ±200ppm/℃; Temperature Rating: -55℃~+125℃; ComponentLink1Description: Datasheet; ComponentLink1URL: https://wmsc.lcsc.com/wmsc/upload/file/pdf/v2/lcsc/2304140030_LIZ-Elec-CR1210J30560G_C102484.pdf; ComponentLink2Description: JLCPCB Part URL; ComponentLink2URL: https://jlcpcb.com/partdetail/C102484
pins: 1, 2
1 alternate drawing of the same symbol

## CR1210J30562G
designator R?  Resistance: 5.6kΩ  (hidden comment: *)
Resistor, 5.6kΩ, ±5%, 750mW, 200V, ±200ppm/℃, -55℃~+125℃, SMD 1210; Manufacturer: Uniroyal; Manufacturer Part Number: CR1210J30562G; Supplier 1: LCSC; Supplier Part Number 1: C102486; JLCPCB Part Number: C102486; Power Rating: 750mW; Category: Resistors; Package Size: 1210; JLCPCB Basic Part: Yes; Tolerance: ±5%; Voltage Rating: 200V; Temperature Coefficient: ±200ppm/℃; Temperature Rating: -55℃~+125℃; ComponentLink1Description: Datasheet; ComponentLink1URL: https://wmsc.lcsc.com/wmsc/upload/file/pdf/v2/lcsc/2304140030_LIZ-Elec-CR1210J30562G_C102486.pdf; ComponentLink2Description: JLCPCB Part URL; ComponentLink2URL: https://jlcpcb.com/partdetail/C102486
pins: 1, 2
1 alternate drawing of the same symbol

## CR1210J30620G
designator R?  Resistance: 62Ω  (hidden comment: *)
Resistor, 62Ω, ±5%, 750mW, 200V, ±200ppm/℃, -55℃~+125℃, SMD 1210; Manufacturer: Uniroyal; Manufacturer Part Number: CR1210J30620G; Supplier 1: LCSC; Supplier Part Number 1: C102489; JLCPCB Part Number: C102489; Power Rating: 750mW; Category: Resistors; Package Size: 1210; JLCPCB Basic Part: Yes; Tolerance: ±5%; Voltage Rating: 200V; Temperature Coefficient: ±200ppm/℃; Temperature Rating: -55℃~+125℃; ComponentLink1Description: Datasheet; ComponentLink1URL: https://wmsc.lcsc.com/wmsc/upload/file/pdf/v2/lcsc/2304140030_LIZ-Elec-CR1210J30620G_C102489.pdf; ComponentLink2Description: JLCPCB Part URL; ComponentLink2URL: https://jlcpcb.com/partdetail/C102489
pins: 1, 2
1 alternate drawing of the same symbol

## CR1210J30622G
designator R?  Resistance: 6.2kΩ  (hidden comment: *)
Resistor, 6.2kΩ, ±5%, 750mW, 200V, ±200ppm/℃, -55℃~+125℃, SMD 1210; Manufacturer: Uniroyal; Manufacturer Part Number: CR1210J30622G; Supplier 1: LCSC; Supplier Part Number 1: C102491; JLCPCB Part Number: C102491; Power Rating: 750mW; Category: Resistors; Package Size: 1210; JLCPCB Basic Part: Yes; Tolerance: ±5%; Voltage Rating: 200V; Temperature Coefficient: ±200ppm/℃; Temperature Rating: -55℃~+125℃; ComponentLink1Description: Datasheet; ComponentLink1URL: https://wmsc.lcsc.com/wmsc/upload/file/pdf/v2/lcsc/2304140030_LIZ-Elec-CR1210J30622G_C102491.pdf; ComponentLink2Description: JLCPCB Part URL; ComponentLink2URL: https://jlcpcb.com/partdetail/C102491
pins: 1, 2
1 alternate drawing of the same symbol

## CR1210J30680G
designator R?  Resistance: 68Ω  (hidden comment: *)
Resistor, 68Ω, ±5%, 750mW, 200V, ±200ppm/℃, -55℃~+125℃, SMD 1210; Manufacturer: Uniroyal; Manufacturer Part Number: CR1210J30680G; Supplier 1: LCSC; Supplier Part Number 1: C102492; JLCPCB Part Number: C102492; Power Rating: 750mW; Category: Resistors; Package Size: 1210; JLCPCB Basic Part: Yes; Tolerance: ±5%; Voltage Rating: 200V; Temperature Coefficient: ±200ppm/℃; Temperature Rating: -55℃~+125℃; ComponentLink1Description: Datasheet; ComponentLink1URL: https://wmsc.lcsc.com/wmsc/upload/file/pdf/v2/lcsc/2304140030_LIZ-Elec-CR1210J30680G_C102492.pdf; ComponentLink2Description: JLCPCB Part URL; ComponentLink2URL: https://jlcpcb.com/partdetail/C102492
pins: 1, 2
1 alternate drawing of the same symbol

## CR1210J30681G
designator R?  Resistance: 680Ω  (hidden comment: *)
Resistor, 680Ω, ±5%, 750mW, 200V, ±200ppm/℃, -55℃~+125℃, SMD 1210; Manufacturer: Uniroyal; Manufacturer Part Number: CR1210J30681G; Supplier 1: LCSC; Supplier Part Number 1: C102493; JLCPCB Part Number: C102493; Power Rating: 750mW; Category: Resistors; Package Size: 1210; JLCPCB Basic Part: Yes; Tolerance: ±5%; Voltage Rating: 200V; Temperature Coefficient: ±200ppm/℃; Temperature Rating: -55℃~+125℃; ComponentLink1Description: Datasheet; ComponentLink1URL: https://wmsc.lcsc.com/wmsc/upload/file/pdf/v2/lcsc/2304140030_LIZ-Elec-CR1210J30681G_C102493.pdf; ComponentLink2Description: JLCPCB Part URL; ComponentLink2URL: https://jlcpcb.com/partdetail/C102493
pins: 1, 2
1 alternate drawing of the same symbol
